# Altium footprint library IC.PcbLib: 163 footprints (part 10 of 11)
Each footprint in its own frame and in the unit in brackets; x right, y up, seen from the top. Pads: shape width x height; smd on the part's side, far side on the other; paste and mask are expansions set on the pad; w line width, h text height; cw(c..) or ccw(c..) is an arc to the next point about the centre after c.
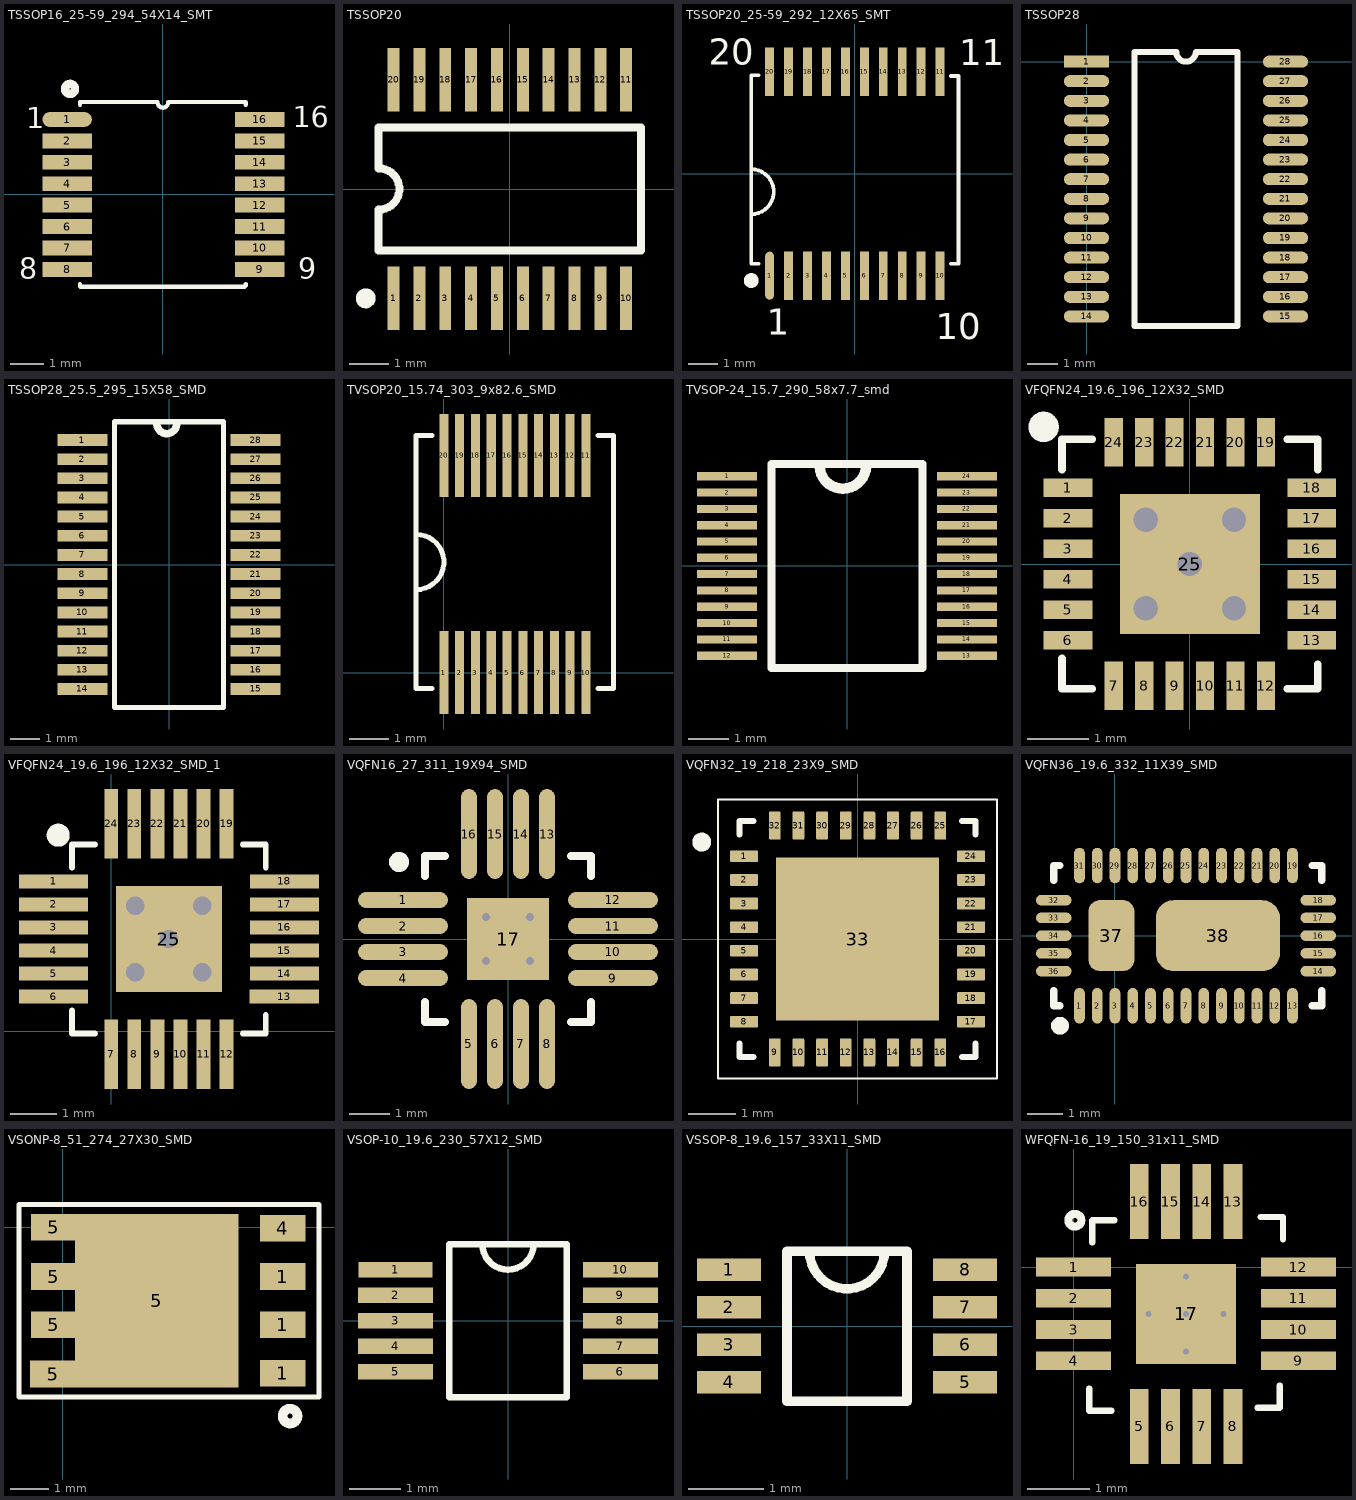
[diagram p9: the footprints below, top view; thin cyan lines are the x and y axes]

## TSSOP16_25-59_294_54X14_SMT [mm] "TSOP, 16-Leads, Body 5.00x4.40mm, Pitch 0.65mm"
height 1.2
pads (16):
  oval 1.5x0.45 smd mask+0.076: 1(-2.908,2.273)
  rect 1.5x0.45 smd mask+0.076: 2(-2.908,1.623) 3(-2.908,0.973) 4(-2.908,0.323) 5(-2.908,-0.327) 6(-2.908,-0.977) 7(-2.908,-1.627) 8(-2.908,-2.277) 9(2.942,-2.277) 10(2.942,-1.627) 11(2.942,-0.977) 12(2.942,-0.327) 13(2.942,0.323) 14(2.942,0.973) 15(2.942,1.623) 16(2.942,2.273)
Top Overlay:
  circle w0.254: c-2.819,3.2 r0.152
  lines w0.127: -2.515,-2.718 -2.515,-2.794 -2.502,-2.807 2.477,-2.807 2.515,-2.769 2.515,-2.718 ; -2.515,2.718 -2.515,2.794 ; -2.515,2.807 -0.164,2.807 ; -0.162,2.796 ccw(c0,2.794) 0.163,2.794 ; 0.164,2.807 2.502,2.807 2.515,2.794 2.515,2.718
  text "1" at -4.152,2.011 h0.64
  text "16" at 3.937,2.032 h0.64
  text "9" at 4.103,-2.561 h0.64
  text "8" at -4.369,-2.565 h0.64
3D body "TSSOP-16 5_1x4_4.STEP": height 1.2, standoff 0.1, extent -3.2,-2.55 3.2,2.55

## TSSOP20 [mm] "Shrink Small Outline; 20 Leads; Body Width 4.4 mm; Pitch 0.65 mm"
height 1.1
pads (20):
  rect 0.3x1.6 smd: 1(-2.925,-2.75) 2(-2.275,-2.75) 3(-1.625,-2.75) 4(-0.975,-2.75) 5(-0.325,-2.75) 6(0.325,-2.75) 7(0.975,-2.75) 8(1.625,-2.75) 9(2.275,-2.75) 10(2.925,-2.75) 11(2.925,2.75) 12(2.275,2.75) 13(1.625,2.75) 14(0.975,2.75) 15(0.325,2.75) 16(-0.325,2.75) 17(-0.975,2.75) 18(-1.625,2.75) 19(-2.275,2.75) 20(-2.925,2.75)
Top Overlay:
  circle w0.25: c-3.625,-2.75 r0.125
  lines w0.2: -3.3,-1.55 -3.3,-0.52 ccw(c-3.3,0) -3.3,0.52 -3.3,1.55 3.3,1.55 3.3,-1.55 -3.3,-1.55
3D body "tssop-20.step": height 1.12, standoff -0.08, extent -3.3,-3.3 3.3,3.3

## TSSOP20_25-59_292_12X65_SMT [mil]
pads (20):
  oval 12x65 smd mask+3: 1(-115.16,-137.8)
  rect 12x65 smd mask+3: 2(-89.56,-137.8) 3(-63.97,-137.8) 4(-38.38,-137.8) 5(-12.8,-137.8) 6(12.8,-137.8) 7(38.38,-137.8) 8(63.98,-137.8) 9(89.56,-137.8) 10(115.16,-137.8) 11(115.16,137.8) 12(89.56,137.8) 13(63.98,137.8) 14(38.38,137.8) 15(12.8,137.8) 16(-12.8,137.8) 17(-38.38,137.8) 18(-63.97,137.8) 19(-89.56,137.8) 20(-115.16,137.8)
Top Overlay:
  circle w10: c-140,-144.3 r5
  lines w5: -140,-54.71 ccw(c-140,-24.3) -140,6.12 ; -130.01,-121.8 -140,-121.8 -140,132.88 -130,132.88 ; 130,-121.8 140,-121.8 140,132.14 130.01,132.14
  text "20" at -197.45,147.05 h35
  text "11" at 141.23,146.45 h35
  text "10" at 109,-223.3 h35
  text "1" at -119,-217.3 h35
3D body "TSSOP-20.STEP": height 47.24, standoff 0, extent -130,-129.76 129.84,128.11

## TSSOP28 [mm]
pads (28):
  rect 1.5x0.4 smd: 1(0,0)
  oval 1.5x0.4 smd: 2(0,-0.65) 3(0,-1.3) 4(0,-1.95) 5(0,-2.6) 6(0,-3.25) 7(0,-3.9) 8(0,-4.55) 9(0,-5.2) 10(0,-5.85) 11(0,-6.5) 12(0,-7.15) 13(0,-7.8) 14(0,-8.45) 15(6.6,-8.45) 16(6.6,-7.8) 17(6.6,-7.15) 18(6.6,-6.5) 19(6.6,-5.85) 20(6.6,-5.2) 21(6.6,-4.55) 22(6.6,-3.9) 23(6.6,-3.25) 24(6.6,-2.6) 25(6.6,-1.95) 26(6.6,-1.3) 27(6.6,-0.65) 28(6.6,0)
Top Overlay:
  lines w0.2: 1.585,0.325 1.585,-8.775 5.015,-8.775 5.015,0.325 3.625,0.325 cw(c3.3,0.325) 2.975,0.325 ; 1.593,0.325 2.983,0.325
3D body "TSSOP-28_P065.STEP": height 0.95, standoff -0.03, extent 0.102,-9.065 6.502,0.635

## TSSOP28_25.5_295_15X58_SMD [mm] "CASE: TSSOP"
height 1.1
pads (28):
  rect 1.7x0.4 smd mask+0.076: 1(-2.938,4.225) 2(-2.938,3.575) 3(-2.938,2.925) 4(-2.938,2.275) 5(-2.938,1.625) 6(-2.938,0.975) 7(-2.938,0.325) 8(-2.938,-0.325) 9(-2.938,-0.975) 10(-2.938,-1.625) 11(-2.938,-2.275) 12(-2.938,-2.925) 13(-2.938,-3.575) 14(-2.938,-4.225) 15(2.938,-4.225) 16(2.938,-3.575) 17(2.938,-2.925) 18(2.938,-2.275) 19(2.938,-1.625) 20(2.938,-0.975) 21(2.938,-0.325) 22(2.938,0.325) 23(2.938,0.975) 24(2.938,1.625) 25(2.938,2.275) 26(2.938,2.925) 27(2.938,3.575) 28(2.938,4.225)
Top Overlay:
  lines w0.178: -1.85,-4.85 -1.85,4.85 1.85,4.85 1.85,-4.85 -1.85,-4.85
  lines w0.254: -0.409,4.745 ccw(c-0.076,4.775) 0.257,4.796
3D body "PCA9685PW,112.stp": height 1.1, standoff 0, extent -3.2,-4.85 3.2,4.85

## TVSOP20_15.74_303_9x82.6_SMD [mm] "TVSOP Package"
height 1.2
pads (20):
  rect 0.23x2.1 smd mask+0.076: 1(0,0) 2(0.4,0) 3(0.8,0) 4(1.2,0) 5(1.6,0) 6(2,0) 7(2.4,0) 8(2.8,0) 9(3.2,0) 10(3.6,0) 11(3.6,5.5) 12(3.2,5.5) 13(2.8,5.5) 14(2.4,5.5) 15(2,5.5) 16(1.6,5.5) 17(1.2,5.5) 18(0.8,5.5) 19(0.4,5.5) 20(0,5.5)
Top Overlay:
  lines w0.127: -0.7,2.1 ccw(c-0.7,2.8) -0.7,3.5 ; -0.3,-0.4 -0.7,-0.4 -0.7,5.1 -0.7,6 ; -0.3,6 -0.7,6 ; 3.9,6 4.3,6 ; -0.7,6 -0.7,6 ; 3.9,-0.4 4.3,-0.4 4.3,6 ; 3.9,-0.4 3.9,-0.4 ; 4.3,6 4.3,6
3D body "SN74CB3Q3245DGVR.stp": height 1.2, standoff 0, extent -0.7,-0.4 4.3,6

## TVSOP-24_15.7_290_58x7.7_smd [mm] "IC TRNSLTR BIDIRECTIONAL 24TVSOP"
height 1.2
pads (24):
  rect 1.475x0.2 smd: 1(-2.938,2.2) 2(-2.938,1.8) 3(-2.938,1.4) 4(-2.938,1) 5(-2.938,0.6) 6(-2.938,0.2) 7(-2.938,-0.2) 8(-2.938,-0.6) 9(-2.938,-1) 10(-2.938,-1.4) 11(-2.938,-1.8) 12(-2.938,-2.2) 13(2.938,-2.2) 14(2.938,-1.8) 15(2.938,-1.4) 16(2.938,-1) 17(2.938,-0.6) 18(2.938,-0.2) 19(2.938,0.2) 20(2.938,0.6) 21(2.938,1) 22(2.938,1.4) 23(2.938,1.8) 24(2.938,2.2)
Top Overlay:
  lines w0.2: -1.85,-2.5 1.85,-2.5 1.85,2.5 -1.85,2.5 -1.85,-2.5
  lines w0.254: -0.672,2.439 ccw(c-0.102,2.464) 0.469,2.441
3D body "SN74LVC8T245DGVR.stp": height 1.2, standoff 0, extent -3.2,-2.5 3.2,2.5

## VFQFN24_19.6_196_12X32_SMD [mm] "CASE: VQFN24"
height 1
pads (25):
  rect 0.8x0.3 smd mask+0.076: 1(-2,1.25) 2(-2,0.75) 3(-2,0.25) 4(-2,-0.25) 5(-2,-0.75) 6(-2,-1.25) 13(2,-1.25) 14(2,-0.75) 15(2,-0.25) 16(2,0.25) 17(2,0.75) 18(2,1.25)
  rect 0.3x0.8 smd mask+0.076: 7(-1.25,-2) 8(-0.75,-2) 9(-0.25,-2) 10(0.25,-2) 11(0.75,-2) 12(1.25,-2) 19(1.25,2) 20(0.75,2) 21(0.25,2) 22(-0.25,2) 23(-0.75,2) 24(-1.25,2)
  rect 2.3x2.3 smd mask+0.076: 25(0,0)
via 0.725,-0.725 diameter 0.8 hole 0.4
via -0.725,-0.725 diameter 0.8 hole 0.4
via -0.725,0.725 diameter 0.8 hole 0.4
via 0.725,0.725 diameter 0.8 hole 0.4
via 0,0 diameter 0.8 hole 0.4
Top Overlay:
  lines w0.127: -2.1,-1.55 -2.1,-2.05 -1.6,-2.05 ; -2.1,1.55 -2.1,2.05 -1.7,2.05 -1.6,2.05 ; 1.6,-2.05 2.1,-2.05 2.1,-1.65 ; 1.6,2.05 2.1,2.05 2.1,1.55
  lines w0.25: -2.283,2.294 ccw(c-2.4,2.25) -2.275,2.25
3D body "DRV8701PRGET.stp": height 1, standoff 0, extent -2.05,-2.05 2.05,2.05

## VFQFN24_19.6_196_12X32_SMD_1 [mm] "CASE: VQFN24"
height 1
pads (25):
  rect 1.5x0.3 smd mask+0.076: 1(-1.25,3.25) 2(-1.25,2.75) 3(-1.25,2.25) 4(-1.25,1.75) 5(-1.25,1.25) 6(-1.25,0.75) 13(3.75,0.75) 14(3.754,1.25) 15(3.754,1.75) 16(3.754,2.25) 17(3.754,2.75) 18(3.754,3.25)
  rect 0.3x1.5 smd mask+0.076: 7(0,-0.5) 8(0.5,-0.5) 9(1,-0.5) 10(1.5,-0.5) 11(2,-0.5) 12(2.5,-0.5) 19(2.5,4.5) 20(2,4.5) 21(1.5,4.5) 22(1,4.5) 23(0.5,4.5) 24(0,4.5)
  rect 2.3x2.3 smd mask+0.076: 25(1.25,2)
via 1.975,1.275 diameter 0.8 hole 0.4
via 0.525,1.275 diameter 0.8 hole 0.4
via 0.525,2.725 diameter 0.8 hole 0.4
via 1.975,2.725 diameter 0.8 hole 0.4
via 1.25,2 diameter 0.8 hole 0.4
Top Overlay:
  lines w0.127: -0.85,0.45 -0.85,-0.05 -0.35,-0.05 ; -0.85,3.55 -0.85,4.05 -0.45,4.05 -0.35,4.05 ; 2.85,-0.05 3.35,-0.05 3.35,0.35 ; 2.85,4.05 3.35,4.05 3.35,3.55
  lines w0.25: -1.033,4.294 ccw(c-1.15,4.25) -1.025,4.25
3D body "DRV8701PRGET.stp": height 1, standoff 0, extent -0.8,-0.05 3.3,4.05

## VQFN16_27_311_19X94_SMD [mm] "PQFN, 16-Leads, Body 4.00x4.00mm, Pitch 0.65mm, Thermal Pad 2.05x2.05mm"
height 1
pads (17):
  oval 2.25x0.4 smd mask+0.076: 1(-2.625,0.975) 2(-2.625,0.325) 3(-2.625,-0.325) 4(-2.625,-0.975) 9(2.625,-0.975) 10(2.625,-0.325) 11(2.625,0.325) 12(2.625,0.975)
  oval 0.4x2.25 smd mask+0.076: 5(-0.975,-2.625) 6(-0.325,-2.625) 7(0.325,-2.625) 8(0.975,-2.625) 13(0.975,2.625) 14(0.325,2.625) 15(-0.325,2.625) 16(-0.975,2.625)
  rect 2.05x2.05 smd mask+0.076: 17(0,0)
via 0.55,-0.55 diameter 0.5 hole 0.2
via -0.55,-0.55 diameter 0.5 hole 0.2
via 0.55,0.55 diameter 0.5 hole 0.2
via -0.55,0.55 diameter 0.5 hole 0.2
Top Overlay:
  circle w0.25: c-2.725,1.925 r0.125
  lines w0.2: -2.075,-1.575 -2.075,-2.075 -1.575,-2.075 ; -2.075,1.575 -2.075,2.075 -1.575,2.075 ; 1.575,-2.075 2.075,-2.075 2.075,-1.575 ; 1.575,2.075 2.075,2.075 2.075,1.575
3D body "INA3221.step": height 1, standoff 0, extent -2.075,-2.075 2.075,2.075

## VQFN32_19_218_23X9_SMD [mm]
pads (33):
  rrect25% 0.6x0.25 smd mask+0: 1(-2.4,1.75) 2(-2.4,1.25) 3(-2.4,0.75) 4(-2.4,0.25) 5(-2.4,-0.25) 6(-2.4,-0.75) 7(-2.4,-1.25) 8(-2.4,-1.75) 17(2.4,-1.75) 18(2.4,-1.25) 19(2.4,-0.75) 20(2.4,-0.25) 21(2.4,0.25) 22(2.4,0.75) 23(2.4,1.25) 24(2.4,1.75)
  rrect25% 0.25x0.6 smd mask+0: 9(-1.75,-2.4) 10(-1.25,-2.4) 11(-0.75,-2.4) 12(-0.25,-2.4) 13(0.25,-2.4) 14(0.75,-2.4) 15(1.25,-2.4) 16(1.75,-2.4) 25(1.75,2.4) 26(1.25,2.4) 27(0.75,2.4) 28(0.25,2.4) 29(-0.25,2.4) 30(-0.75,2.4) 31(-1.25,2.4) 32(-1.75,2.4)
  rect 3.45x3.45 smd paste-3 mask+0: 33(0,0)
Top Overlay:
  circle w0.2: c-3.295,2.05 r0.1
  lines w0.05: -2.95,-2.95 2.95,-2.95 2.95,2.95 -2.95,2.95 -2.95,-2.95
  lines w0.127: -2.5,-2.205 -2.5,-2.5 -2.205,-2.5 ; -2.5,2.205 -2.5,2.5 -2.205,2.5 ; 2.205,-2.5 2.5,-2.5 2.5,-2.205 ; 2.205,2.5 2.5,2.5 2.5,2.205
Top Paste:
  region: 1.59,-1.59 0.1,-1.59 0.1,-0.1 1.59,-0.1
  region: -0.1,-1.59 -1.59,-1.59 -1.59,-0.1 -0.1,-0.1
  region: 1.59,0.1 0.1,0.1 0.1,1.59 1.59,1.59
  region: -0.1,0.1 -1.59,0.1 -1.59,1.59 -0.1,1.59
Top Solder:
  drawing of 33 lines, arcs and shapes, not listed
3D body "User Library-VQFN-32.step": height 1.01, standoff 0, extent -2.56,-2.56 2.56,2.56

## VQFN36_19.6_332_11X39_SMD [mm] "QFN, 36-Leads, Body 7.15x3.65mm, Pitch 0.50mm, Thermal Pad 6.30x2.20mm, IPC Medium Density"
height 1
pads (38):
  oval 0.3x1 smd mask+0.076: 1(-1,-1.975) 2(-0.5,-1.975) 3(0,-1.975) 4(0.5,-1.975) 5(1,-1.975) 6(1.5,-1.975) 7(2,-1.975) 8(2.5,-1.975) 9(3,-1.975) 10(3.5,-1.975) 11(4,-1.975) 12(4.5,-1.975) 13(5,-1.975) 19(5,1.975) 20(4.5,1.975) 21(4,1.975) 22(3.5,1.975) 23(3,1.975) 24(2.5,1.975) 25(2,1.975) 26(1.5,1.975) 27(1,1.975) 28(0.5,1.975) 29(0,1.975) 30(-0.5,1.975) 31(-1,1.975)
  oval 1x0.3 smd mask+0.076: 14(5.725,-1) 15(5.725,-0.5) 16(5.725,0) 17(5.725,0.5) 18(5.725,1) 32(-1.725,1) 33(-1.725,0.5) 34(-1.725,0) 35(-1.725,-0.5) 36(-1.725,-1)
  rrect50% 1.3x2 smd: 37(-0.1,0)
  rrect50% 3.5x2 smd: 38(2.9,0)
Top Overlay:
  circle w0.25: c-1.55,-2.54 r0.125
  lines w0.2: -1.725,-1.55 -1.725,-1.975 -1.55,-1.975 ; -1.725,1.55 -1.725,1.975 -1.55,1.975 ; 5.55,-1.975 5.825,-1.975 5.825,-1.55 ; 5.55,1.975 5.825,1.975 5.825,1.55
3D body "VQFN36.step": height 1, standoff 0, extent -1.625,-1.875 5.625,1.875

## VSONP-8_51_274_27X30_SMD [mm] "CASE: VSONP"
height 1.1
pads (9):
  rect 1.2x0.7 smd: 1(5.776,-3.83) 1(5.776,-2.56) 1(5.776,-1.29) 4(5.776,-0.02) 5(-0.249,-3.85) 5(-0.226,-2.56) 5(-0.226,-1.29) 5(-0.226,0)
  rect 4.295x4.55 smd: 5(2.475,-1.925)
Top Overlay:
  circle w0.254: c5.971,-4.953 r0.195
  lines w0.127: -1.143,-4.45 6.731,-4.45 6.731,0.6 -1.143,0.6 -1.143,-4.45
3D body "User Library-VSON-8.step": height 1.01, standoff 0.01, extent -0.226,-4.425 5.776,0.575

## VSOP-10_19.6_230_57X12_SMD [mm] "VSOP Package"
height 1.1
pads (10):
  rect 1.45x0.3 smd mask+0.076: 1(-2.2,1)
  rect 1.47x0.3 smd mask+0.076: 2(-2.2,0.5) 3(-2.2,0) 4(-2.2,-0.5) 5(-2.2,-1) 6(2.2,-1) 7(2.2,-0.5) 8(2.2,0) 9(2.2,0.5) 10(2.2,1)
Top Overlay:
  lines w0.127: -0.5,1.5 ccw(c0,1.5) 0.5,1.499 ; -1.15,-1.5 1.15,-1.5 1.15,1.5 -1.15,1.5 -1.15,-1.5
3D body "ADS1115IDGSR--3DModel-STEP-56544.STEP": height 1.07, standoff -0.03, extent -2.45,-1.5 2.45,1.5

## VSSOP-8_19.6_157_33X11_SMD [mm] "VSSOP"
height 0.9
pads (8):
  rect 0.85x0.3 smd mask+0.076: 1(-1.575,0.75) 2(-1.575,0.25) 3(-1.575,-0.25) 4(-1.575,-0.75) 5(1.575,-0.75) 6(1.575,-0.25) 7(1.575,0.25) 8(1.575,0.75)
Top Overlay:
  lines w0.127: -0.5,1 ccw(c0,1) 0.5,1 ; -0.8,-1 -0.8,1 0.8,1 0.8,-1 -0.8,-1
3D body "74AUP2G86DC,125.stp": height 1, standoff 0, extent -1.55,-1 1.55,1

## WFQFN-16_19_150_31x11_SMD [mm] "WFQFN"
height 0.8
pads (17):
  rect 1.2x0.3 smd mask+0.076: 1(0,0) 2(0,-0.5) 3(0,-1) 4(0,-1.5) 9(3.6,-1.5) 10(3.6,-1) 11(3.6,-0.5) 12(3.6,0)
  rect 0.3x1.2 smd mask+0.076: 5(1.05,-2.55) 6(1.55,-2.55) 7(2.05,-2.55) 8(2.55,-2.55) 13(2.55,1.05) 14(2.05,1.05) 15(1.55,1.05) 16(1.05,1.05)
  rect 1.6x1.6 smd mask+0.076: 17(1.8,-0.75)
via 1.8,-0.75 diameter 0.2 hole 0.1
via 1.8,-1.35 diameter 0.2 hole 0.1
via 1.8,-0.15 diameter 0.2 hole 0.1
via 1.2,-0.75 diameter 0.2 hole 0.1
via 2.4,-0.75 diameter 0.2 hole 0.1
Top Overlay:
  circle w0.127: c0.022,0.75 r0.103
  lines w0.1: 0.25,-1.943 0.25,-2.3 0.607,-2.3 ; 0.3,0.393 0.3,0.75 0.657,0.75 ; 2.943,-2.25 3.3,-2.25 3.3,-1.893 ; 2.993,0.8 3.35,0.8 3.35,0.443
3D body "FSA2567MPX.stp": height 0.8, standoff 0, extent 0.25,-2.3 3.35,0.8